# Altium footprint library ICs And Semiconductors SMD_BGA.PcbLib: 118 footprints (part 1 of 17)
Each footprint in its own frame and in the unit in brackets; x right, y up, seen from the top. Pads: shape width x height; smd on the part's side, far side on the other; paste and mask are expansions set on the pad; w line width, h text height; cw(c..) or ccw(c..) is an arc to the next point about the centre after c.
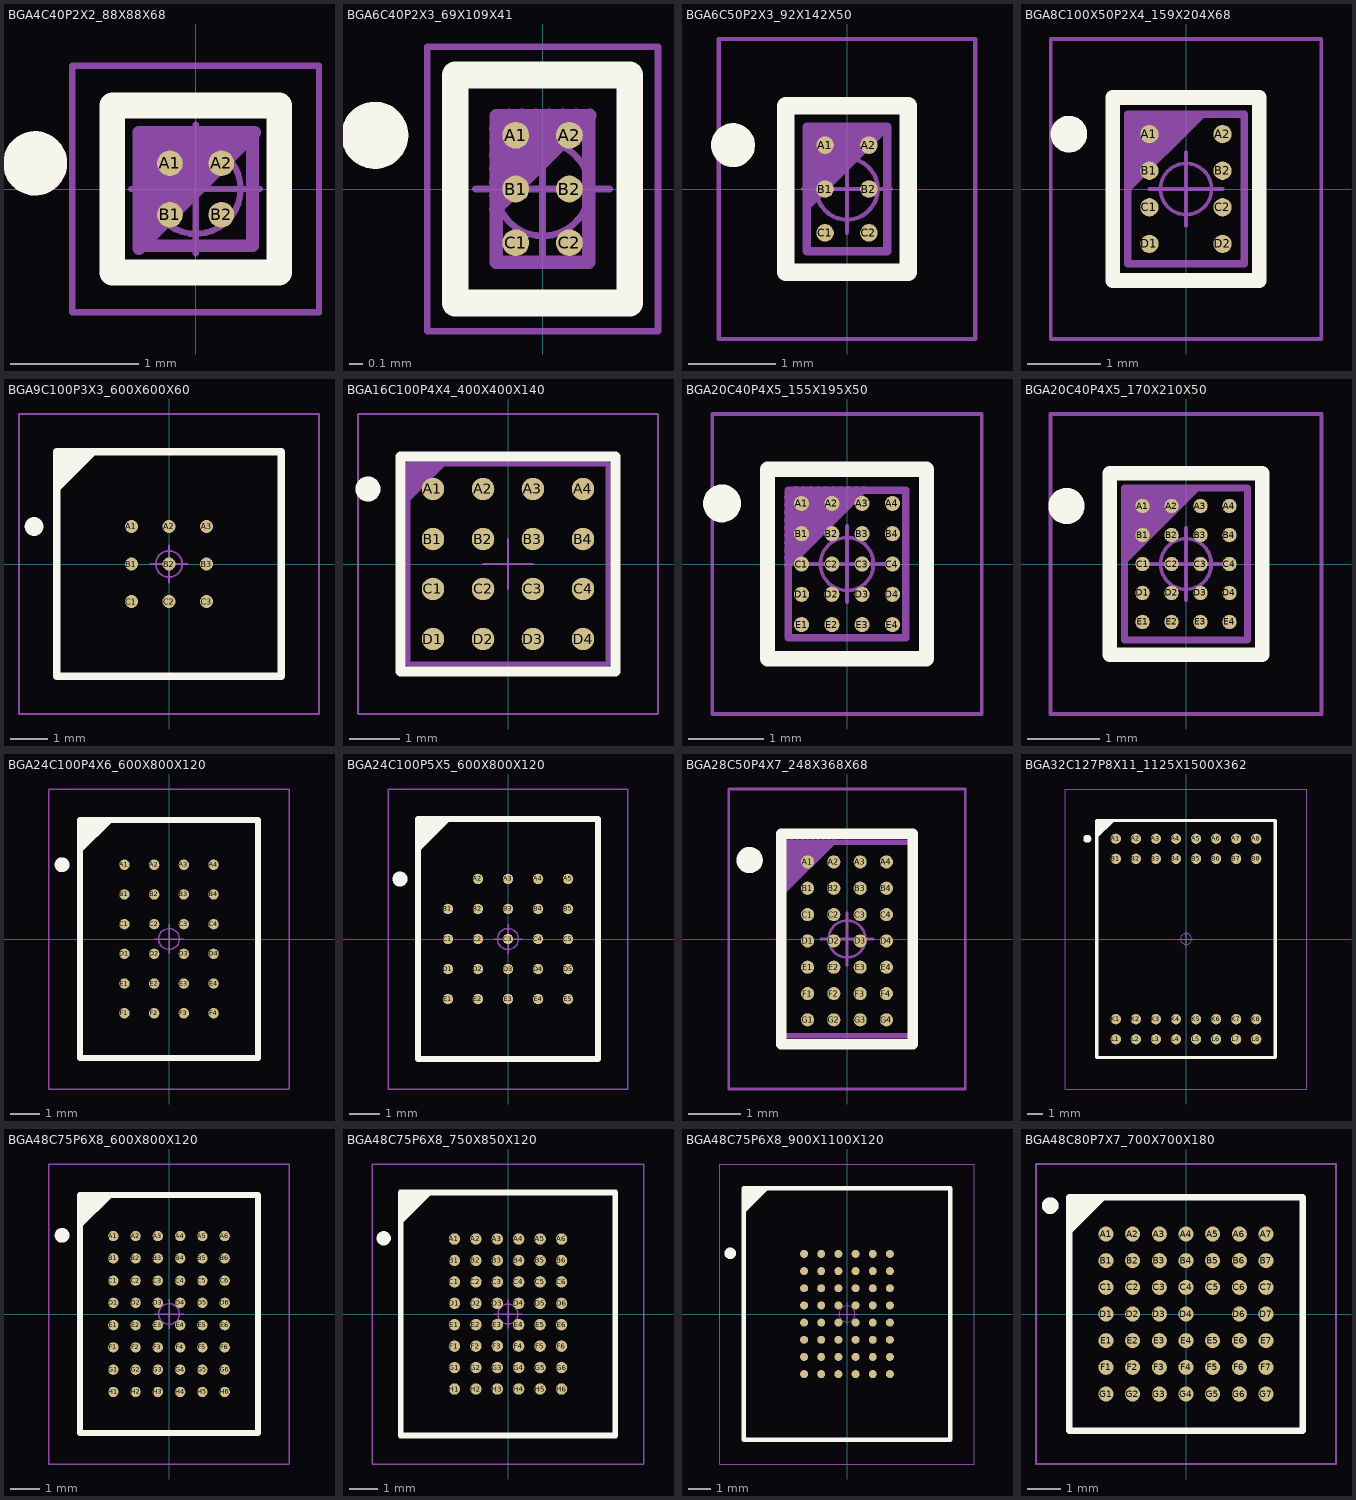
[diagram p0: the footprints below, top view; thin cyan lines are the x and y axes]

## BGA4C40P2X2_88X88X68 [mm] "BGA, 0.40mm Pitch, Square; 4 Pin, 2 Columns X 2 Rows, 0.884mm X 0.884mm X 0.675mm H"
height 0.675
pads (4):
  round 0.2 smd: A1(-0.2,0.2) A2(0.2,0.2) B1(-0.2,-0.2) B2(0.2,-0.2)
Top Overlay:
  circle w0.25: c-1.25,0.2 r0.125
  lines w0.2: -0.65,-0.65 0.65,-0.65 0.65,0.65 -0.65,0.65 -0.65,-0.65
Mechanical 14:
  lines w0.1: -0.442,-0.442 0.442,-0.442 0.442,0.442 -0.442,0.442 -0.442,-0.462 0.46,0.44 ; -0.44,-0.36 0.36,0.44 ; -0.44,-0.26 0.26,0.44 ; -0.44,-0.16 0.16,0.44 ; -0.44,-0.06 0.06,0.44 ; -0.44,0.04 -0.04,0.44 ; -0.44,0.14 -0.14,0.44 ; -0.44,0.24 -0.24,0.44 ; -0.44,0.34 -0.34,0.44
  text "1" at 0.45,-0.164 h0.75
Mechanical 15:
  circle w0.05: c0,0 r0.35
  lines w0.05: -0.5,0 0.5,0 ; 0,-0.5 0,0.5 ; -0.96,-0.96 0.96,-0.96 0.96,0.96 -0.96,0.96 -0.96,-0.96
3D body "BGA4C40P2X2_88X88X68.stp": height 0.67, standoff 0, extent -0.457,-0.457 0.457,0.457

## BGA6C40P2X3_69X109X41 [mm] "BGA, 0.40mm Pitch, Rect.; 6 Pin, 2 Columns X 3 rows, 0.69mm X 1.09mm X 0.41mm H"
height 0.41
pads (6):
  round 0.2 smd: A1(-0.2,0.4) A2(0.2,0.4) B1(-0.2,0) B2(0.2,0) C1(-0.2,-0.4) C2(0.2,-0.4)
Top Overlay:
  circle w0.25: c-1.25,0.4 r0.125
  lines w0.2: -0.65,-0.85 0.65,-0.85 0.65,0.85 -0.65,0.85 -0.65,-0.85
Mechanical 14:
  lines w0.1: -0.35,-0.15 0.35,0.55 ; -0.35,-0.05 0.25,0.55 ; -0.35,0.05 0.15,0.55 ; -0.35,0.15 0.05,0.55 ; -0.35,0.25 -0.05,0.55 ; -0.35,0.35 -0.15,0.55 ; -0.35,0.45 -0.25,0.55 ; -0.345,-0.545 0.345,-0.545 0.345,0.545 -0.345,0.545 -0.345,-0.545
Mechanical 15:
  circle w0.05: c0,0 r0.35
  lines w0.05: -0.5,0 0.5,0 ; 0,-0.5 0,0.5 ; -0.86,-1.06 0.86,-1.06 0.86,1.06 -0.86,1.06 -0.86,-1.06
3D body "BGA6C40P2X3_69X109X41.stp": height 0.41, standoff 0, extent -0.345,-0.545 0.345,0.545

## BGA6C50P2X3_92X142X50 [mm] "BGA, 0.40mm Pitch, Rect.; 6 Pin, 2 Columns X 3 rows, 0.92mm X 1.42mm X 0.50mm H"
height 0.5
pads (6):
  round 0.2 smd: A1(-0.25,0.5) A2(0.25,0.5) B1(-0.25,0) B2(0.25,0) C1(-0.25,-0.5) C2(0.25,-0.5)
Top Overlay:
  circle w0.25: c-1.3,0.5 r0.125
  lines w0.2: -0.7,-0.95 -0.7,0.95 0.7,0.95 0.7,-0.95 -0.7,-0.95
Mechanical 14:
  lines w0.1: -0.46,-0.19 0.44,0.71 ; -0.46,-0.09 0.34,0.71 ; -0.46,0.01 0.24,0.71 ; -0.46,0.11 0.14,0.71 ; -0.46,0.21 0.04,0.71 ; -0.46,0.31 -0.06,0.71 ; -0.46,0.41 -0.16,0.71 ; -0.46,0.51 -0.26,0.71 ; -0.46,0.61 -0.36,0.71 ; -0.46,-0.71 -0.46,0.71 0.46,0.71 0.46,-0.71 -0.46,-0.71
Mechanical 15:
  circle w0.05: c0,0 r0.35
  lines w0.05: -0.5,0 0.5,0 ; 0,-0.5 0,0.5 ; -1.46,-1.71 -1.46,1.71 1.46,1.71 1.46,-1.71 -1.46,-1.71
3D body "BGA6C50P2X3_92X142X50.stp": height 0.5, standoff 0, extent -0.46,-0.71 0.46,0.71

## BGA8C100X50P2X4_159X204X68 [mm] "BGA, 1.00mm Pitch, Body 1.59x2.04x0.68mm; 8 Pin, 2 Columns X 4 Rows"
height 0.68
pads (8):
  round 0.25 smd: A1(-0.5,0.75) A2(0.5,0.75) B1(-0.5,0.25) B2(0.5,0.25) C1(-0.5,-0.25) C2(0.5,-0.25) D1(-0.5,-0.75) D2(0.5,-0.75)
Top Overlay:
  circle w0.25: c-1.6,0.75 r0.125
  lines w0.2: -1,-1.25 1,-1.25 1,1.25 -1,1.25 -1,-1.25
Mechanical 14:
  lines w0.1: -0.8,0 0.2,1 ; -0.8,0.1 0.1,1 ; -0.8,0.2 0,1 ; -0.8,0.3 -0.1,1 ; -0.8,0.4 -0.2,1 ; -0.8,0.5 -0.3,1 ; -0.8,0.6 -0.4,1 ; -0.8,0.7 -0.5,1 ; -0.8,0.8 -0.6,1 ; -0.8,0.9 -0.7,1 ; -0.795,-1.02 0.795,-1.02 0.795,1.02 -0.795,1.02 -0.795,-1.02
Mechanical 15:
  circle w0.05: c0,0 r0.35
  lines w0.05: -0.5,0 0.5,0 ; 0,-0.5 0,0.5 ; -1.85,-2.05 1.85,-2.05 1.85,2.05 -1.85,2.05 -1.85,-2.05
3D body "BGA8C100X50P2X4_159X204X68.stp": height 0.68, standoff 0, extent -0.81,-1.035 0.81,1.035

## BGA9C100P3X3_600X600X60 [mm] "BGA, 1.00mm Pitch, Body 6.00x6.00x0.60mm; 9 Pin, 3 Columns X 3 Rows"
height 0.6
pads (9):
  round 0.35 smd: A1(-1,1) A2(0,1) A3(1,1) B1(-1,0) B2(0,0) B3(1,0) C1(-1,-1) C2(0,-1) C3(1,-1)
Top Overlay:
  circle w0.25: c-3.6,1 r0.125
  lines w0.2: -3,2 -2,3 ; -3,2.2 -2.2,3 ; -3,2.4 -2.4,3 ; -3,2.6 -2.6,3 ; -3,2.8 -2.8,3 ; -3,-3 -3,3 3,3 3,-3 -3,-3
Mechanical 14:
  lines w0.1: -3,2 -2,3 ; -3,2.1 -2.1,3 ; -3,2.2 -2.2,3 ; -3,2.3 -2.3,3 ; -3,2.4 -2.4,3 ; -3,2.5 -2.5,3 ; -3,2.6 -2.6,3 ; -3,2.7 -2.7,3 ; -3,2.8 -2.8,3 ; -3,2.9 -2.9,3 ; -3,-3 -3,3 3,3 3,-3 -3,-3
Mechanical 15:
  circle w0.05: c0,0 r0.35
  lines w0.05: -0.5,0 0.5,0 ; 0,-0.5 0,0.5 ; -4,-4 -4,4 4,4 4,-4 -4,-4
3D body "BGA9C100P3X3_600X600X60.stp": height 0.6, standoff 0, extent -3.05,-3.05 3.05,3.05

## BGA16C100P4X4_400X400X140 [mm] "BGA, 1.00mm pitch, square; 16 pin, 4 columns X 4 rows, 4.00mm X 4.00mm"
height 1.4
pads (16):
  round 0.45 smd: A1(-1.5,1.5) A2(-0.5,1.5) A3(0.5,1.5) A4(1.5,1.5) B1(-1.5,0.5) B2(-0.5,0.5) B3(0.5,0.5) B4(1.5,0.5) C1(-1.5,-0.5) C2(-0.5,-0.5) C3(0.5,-0.5) C4(1.5,-0.5) D1(-1.5,-1.5) D2(-0.5,-1.5) D3(0.5,-1.5) D4(1.5,-1.5)
Top Overlay:
  circle w0.25: c-2.8,1.5 r0.125
  lines w0.2: -2.15,-2.15 -2.15,2.15 2.15,2.15 2.15,-2.15 -2.15,-2.15
Mechanical 14:
  lines w0.1: -2,1.3 -1.3,2 ; -2,1.4 -1.4,2 ; -2,1.5 -1.5,2 ; -2,1.6 -1.6,2 ; -2,1.7 -1.7,2 ; -2,1.8 -1.8,2 ; -2,1.9 -1.9,2 ; -2,-2 -2,2 2,2 2,-2 -2,-2
Mechanical 15:
  lines w0.05: -0.5,0 0.5,0 ; 0,-0.5 0,0.5 ; -3,-3 -3,3 3,3 3,-3 -3,-3
3D body "BGA16C100P4X4_400X400X140.stp": height 1.4, standoff 0, extent -2,-2 2,2

## BGA20C40P4X5_155X195X50 [mm] "BGA, 0.40mm Pitch, Rect, 20 Pin, 4 Columns X 5 rows, 1.55mm X 1.95mm X 0.50mm H"
height 0.5
pads (20):
  round 0.2 smd: A1(-0.6,0.8) A2(-0.2,0.8) A3(0.2,0.8) A4(0.6,0.8) B1(-0.6,0.4) B2(-0.2,0.4) B3(0.2,0.4) B4(0.6,0.4) C1(-0.6,0) C2(-0.2,0) C3(0.2,0) C4(0.6,0) D1(-0.6,-0.4) D2(-0.2,-0.4) D3(0.2,-0.4) D4(0.6,-0.4) E1(-0.6,-0.8) E2(-0.2,-0.8) E3(0.2,-0.8) E4(0.6,-0.8)
Top Overlay:
  circle w0.25: c-1.65,0.8 r0.125
  lines w0.2: -1.05,-1.25 1.05,-1.25 1.05,1.25 -1.05,1.25 -1.05,-1.25
Mechanical 14:
  lines w0.1: -0.78,-0.02 0.22,0.98 ; -0.78,0.08 0.12,0.98 ; -0.78,0.18 0.02,0.98 ; -0.78,0.28 -0.08,0.98 ; -0.78,0.38 -0.18,0.98 ; -0.78,0.48 -0.28,0.98 ; -0.78,0.58 -0.38,0.98 ; -0.78,0.68 -0.48,0.98 ; -0.78,0.78 -0.58,0.98 ; -0.78,0.88 -0.68,0.98 ; -0.775,-0.975 0.775,-0.975 0.775,0.975 -0.775,0.975 -0.775,-0.975
Mechanical 15:
  circle w0.05: c0,0 r0.35
  lines w0.05: -0.5,0 0.5,0 ; 0,-0.5 0,0.5 ; -1.78,-1.98 1.78,-1.98 1.78,1.98 -1.78,1.98 -1.78,-1.98
3D body "BGA20C40P4X5_155X195X50.stp": height 0.5, standoff 0, extent -0.775,-0.975 0.775,0.975

## BGA20C40P4X5_170X210X50 [mm] "BGA, 0.40mm Pitch, Rect, 20 Pin, 4 Columns X 5 Rows, 1.70mm X 2.10mm X 0.50mm H"
height 0.5
pads (20):
  round 0.2 smd: A1(-0.6,0.8) A2(-0.2,0.8) A3(0.2,0.8) A4(0.6,0.8) B1(-0.6,0.4) B2(-0.2,0.4) B3(0.2,0.4) B4(0.6,0.4) C1(-0.6,0) C2(-0.2,0) C3(0.2,0) C4(0.6,0) D1(-0.6,-0.4) D2(-0.2,-0.4) D3(0.2,-0.4) D4(0.6,-0.4) E1(-0.6,-0.8) E2(-0.2,-0.8) E3(0.2,-0.8) E4(0.6,-0.8)
Top Overlay:
  circle w0.25: c-1.65,0.8 r0.125
  lines w0.2: -1.05,-1.25 1.05,-1.25 1.05,1.25 -1.05,1.25 -1.05,-1.25
Mechanical 8:
  lines w0.001: -0.85,-1.05 0.85,-1.05 0.85,1.05 -0.85,1.05 -0.85,-1.05
Mechanical 14:
  lines w0.1: -0.85,0.05 0.15,1.05 ; -0.85,0.15 0.05,1.05 ; -0.85,0.25 -0.05,1.05 ; -0.85,0.35 -0.15,1.05 ; -0.85,0.45 -0.25,1.05 ; -0.85,0.55 -0.35,1.05 ; -0.85,0.65 -0.45,1.05 ; -0.85,0.75 -0.55,1.05 ; -0.85,0.85 -0.65,1.05 ; -0.85,0.95 -0.75,1.05 ; -0.85,-1.05 0.85,-1.05 0.85,1.05 -0.85,1.05 -0.85,-1.05
  text "1" at 0.45,-0.164 h0.75
Mechanical 15:
  circle w0.05: c0,0 r0.35
  lines w0.05: -0.5,0 0.5,0 ; 0,-0.5 0,0.5 ; -1.87,-2.07 1.87,-2.07 1.87,2.07 -1.87,2.07 -1.87,-2.07
3D body "BGA20C40P4X5_170X210X50.stp": height 0.5, standoff 0, extent -0.85,-1.05 0.85,1.05

## BGA24C100P4X6_600X800X120 [mm] "BGA, 1.00mm Pitch, Rect.; 24 Pin, 4 Columns X 6 Rows, 6.00mm X 8.00mm X 1.20mm H"
height 1.2
pads (24):
  round 0.35 smd: A1(-1.5,2.5) A2(-0.5,2.5) A3(0.5,2.5) A4(1.5,2.5) B1(-1.5,1.5) B2(-0.5,1.5) B3(0.5,1.5) B4(1.5,1.5) C1(-1.5,0.5) C2(-0.5,0.5) C3(0.5,0.5) C4(1.5,0.5) D1(-1.5,-0.5) D2(-0.5,-0.5) D3(0.5,-0.5) D4(1.5,-0.5) E1(-1.5,-1.5) E2(-0.5,-1.5) E3(0.5,-1.5) E4(1.5,-1.5) F1(-1.5,-2.5) F2(-0.5,-2.5) F3(0.5,-2.5) F4(1.5,-2.5)
Top Overlay:
  circle w0.25: c-3.6,2.5 r0.125
  lines w0.2: -3,3 -2,4 ; -3,3.2 -2.2,4 ; -3,3.4 -2.4,4 ; -3,3.6 -2.6,4 ; -3,3.8 -2.8,4 ; -3,-4 -3,4 3,4 3,-4 -3,-4
Mechanical 14:
  lines w0.1: -3,3 -2,4 ; -3,3.1 -2.1,4 ; -3,3.2 -2.2,4 ; -3,3.3 -2.3,4 ; -3,3.4 -2.4,4 ; -3,3.5 -2.5,4 ; -3,3.6 -2.6,4 ; -3,3.7 -2.7,4 ; -3,3.8 -2.8,4 ; -3,3.9 -2.9,4 ; -3,-4 -3,4 3,4 3,-4 -3,-4
Mechanical 15:
  circle w0.05: c0,0 r0.35
  lines w0.05: -0.5,0 0.5,0 ; 0,-0.5 0,0.5 ; -4.05,-5.05 -4.05,5.05 4.05,5.05 4.05,-5.05 -4.05,-5.05
3D body "BGA24C100P4X6_600X800X120.stp": height 1, standoff 0, extent -3,-4 3,4

## BGA24C100P5X5_600X800X120 [mm] "BGA, 1.00mm Pitch, Rect.; 24 Pin, 5 Columns X 5 rows,6.00mm X 8.00mm X 1.20mm H"
height 1.4
pads (24):
  round 0.35 smd: A2(-1,2) A3(0,2) A4(1,2) A5(2,2) B1(-2,1) B2(-1,1) B3(0,1) B4(1,1) B5(2,1) C1(-2,0) C2(-1,0) C3(0,0) C4(1,0) C5(2,0) D1(-2,-1) D2(-1,-1) D3(0,-1) D4(1,-1) D5(2,-1) E1(-2,-2) E2(-1,-2) E3(0,-2) E4(1,-2) E5(2,-2)
Top Overlay:
  circle w0.25: c-3.6,2 r0.125
  lines w0.2: -3,3 -2,4 ; -3,3.2 -2.2,4 ; -3,3.4 -2.4,4 ; -3,3.6 -2.6,4 ; -3,3.8 -2.8,4 ; -3,-4 -3,4 3,4 3,-4 -3,-4
Mechanical 14:
  lines w0.1: -3,3 -2,4 ; -3,3.1 -2.1,4 ; -3,3.2 -2.2,4 ; -3,3.3 -2.3,4 ; -3,3.4 -2.4,4 ; -3,3.5 -2.5,4 ; -3,3.6 -2.6,4 ; -3,3.7 -2.7,4 ; -3,3.8 -2.8,4 ; -3,3.9 -2.9,4 ; -3,-4 -3,4 3,4 3,-4 -3,-4
Mechanical 15:
  circle w0.05: c0,0 r0.35
  lines w0.05: -0.5,0 0.5,0 ; 0,-0.5 0,0.5 ; -4,-5 -4,5 4,5 4,-5 -4,-5
3D body "BGA24C100P5X5_600X800X120.stp": height 1.2, standoff 0, extent -3,-4 3,4

## BGA28C50P4X7_248X368X68 [mm] "BGA, 0.50mm Pitch, Body 2.48x3.68x0.68mm; 28 Pin, 4 Columns X 7 Rows"
height 0.68
pads (28):
  round 0.25 smd: A1(-0.75,1.464) A2(-0.25,1.464) A3(0.25,1.464) A4(0.75,1.464) B1(-0.75,0.964) B2(-0.25,0.964) B3(0.25,0.964) B4(0.75,0.964) C1(-0.75,0.464) C2(-0.25,0.464) C3(0.25,0.464) C4(0.75,0.464) D1(-0.75,-0.036) D2(-0.25,-0.036) D3(0.25,-0.036) D4(0.75,-0.036) E1(-0.75,-0.536) E2(-0.25,-0.536) E3(0.25,-0.536) E4(0.75,-0.536) F1(-0.75,-1.036) F2(-0.25,-1.036) F3(0.25,-1.036) F4(0.75,-1.036) G1(-0.75,-1.536) G2(-0.25,-1.536) G3(0.25,-1.536) G4(0.75,-1.536)
Top Overlay:
  circle w0.25: c-1.85,1.5 r0.125
  lines w0.2: -1.25,-2 1.25,-2 1.25,2 -1.25,2 -1.25,-2
Mechanical 14:
  lines w0.1: -1.25,0.85 -0.25,1.85 ; -1.25,0.95 -0.35,1.85 ; -1.25,1.05 -0.45,1.85 ; -1.25,1.15 -0.55,1.85 ; -1.25,1.25 -0.65,1.85 ; -1.25,1.35 -0.75,1.85 ; -1.25,1.45 -0.85,1.85 ; -1.25,1.55 -0.95,1.85 ; -1.25,1.65 -1.05,1.85 ; -1.25,1.75 -1.15,1.85 ; -1.24,-1.84 1.24,-1.84 1.24,1.84 -1.24,1.84 -1.24,-1.84
  text "A" at -1.8,1.35 h0.4
  text "G" at -1.85,-1.725 h0.4
  text "1" at -0.85,2.2 h0.4
  text "4" at 0.625,2.175 h0.4
Mechanical 15:
  circle w0.05: c0,0 r0.35
  lines w0.05: -0.5,0 0.5,0 ; 0,-0.5 0,0.5 ; -2.25,-2.85 2.25,-2.85 2.25,2.85 -2.25,2.85 -2.25,-2.85
3D body "BGA28C50P4X7_248X368X68.stp": height 0.68, standoff 0, extent -1.24,-1.84 1.24,1.84

## BGA32C127P8X11_1125X1500X362 [mm] "BGA, 1.27mm Pitch, Rect.;32 Pin,8 Columns X 11 Rows, 11.25mm X 15.00mm X 3.62mm H"
height 3.62
pads (32):
  round 0.65 smd: A1(-4.445,6.35) A2(-3.175,6.35) A3(-1.905,6.35) A4(-0.635,6.35) A5(0.635,6.35) A6(1.905,6.35) A7(3.175,6.35) A8(4.445,6.35) B1(-4.445,5.08) B2(-3.175,5.08) B3(-1.905,5.08) B4(-0.635,5.08) B5(0.635,5.08) B6(1.905,5.08) B7(3.175,5.08) B8(4.445,5.08) K1(-4.445,-5.08) K2(-3.175,-5.08) K3(-1.905,-5.08) K4(-0.635,-5.08) K5(0.635,-5.08) K6(1.905,-5.08) K7(3.175,-5.08) K8(4.445,-5.08) L1(-4.445,-6.35) L2(-3.175,-6.35) L3(-1.905,-6.35) L4(-0.635,-6.35) L5(0.635,-6.35) L6(1.905,-6.35) L7(3.175,-6.35) L8(4.445,-6.35)
Top Overlay:
  circle w0.25: c-6.25,6.35 r0.125
  lines w0.2: -5.65,6.5 -4.65,7.5 ; -5.65,6.7 -4.85,7.5 ; -5.65,6.9 -5.05,7.5 ; -5.65,7.1 -5.25,7.5 ; -5.65,7.3 -5.45,7.5 ; -5.65,-7.5 5.65,-7.5 5.65,7.5 -5.65,7.5 -5.65,-7.5
Mechanical 14:
  lines w0.1: -5.65,6.5 -4.65,7.5 ; -5.65,6.6 -4.75,7.5 ; -5.65,6.7 -4.85,7.5 ; -5.65,6.8 -4.95,7.5 ; -5.65,6.9 -5.05,7.5 ; -5.65,7 -5.15,7.5 ; -5.65,7.1 -5.25,7.5 ; -5.65,7.2 -5.35,7.5 ; -5.65,7.3 -5.45,7.5 ; -5.65,7.4 -5.55,7.5 ; -5.625,-7.5 5.625,-7.5 5.625,7.5 -5.625,7.5 -5.625,-7.5
  text "L" at -6.895,-6.6 h0.6
  text "K" at -6.895,-5.33 h0.6
  text "J" at -6.895,-4.06 h0.6
  text "H" at -6.895,-2.79 h0.6
  text "G" at -6.895,-1.52 h0.6
  text "F" at -6.895,-0.25 h0.6
  text "E" at -6.895,1.02 h0.6
  text "D" at -6.895,2.29 h0.6
  text "C" at -6.895,3.56 h0.6
  text "B" at -6.895,4.83 h0.6
  text "A" at -6.895,6.1 h0.6
  text "8" at 4.73,8.35 h0.6
  text "1" at -4.22,8.4 h0.6
  text "7" at 3.46,8.35 h0.6
  text "6" at 2.19,8.35 h0.6
  text "5" at 0.92,8.35 h0.6
  text "4" at -0.35,8.35 h0.6
  text "3" at -1.62,8.35 h0.6
  text "2" at -2.89,8.35 h0.6
Mechanical 15:
  circle w0.05: c0,0 r0.35
  lines w0.05: -0.5,0 0.5,0 ; 0,-0.5 0,0.5 ; -7.65,-9.5 7.65,-9.5 7.65,9.5 -7.65,9.5 -7.65,-9.5
3D body "BGA32C127P8X11_1125X1500X362.stp": height 3.62, standoff 0, extent -5.625,-7.5 5.625,7.5

## BGA48C75P6X8_600X800X120 [mm] "BGA, 0.75mm Pitch, Rect.; 48 Pin, 6 Columns X 8 Rows, 6mm X 8mm X 1.20mm H, IPC Medium Density"
height 1.2
pads (48):
  round 0.35 smd: A1(-1.875,2.625) A2(-1.125,2.625) A3(-0.375,2.625) A4(0.375,2.625) A5(1.125,2.625) A6(1.875,2.625) B1(-1.875,1.875) B2(-1.125,1.875) B3(-0.375,1.875) B4(0.375,1.875) B5(1.125,1.875) B6(1.875,1.875) C1(-1.875,1.125) C2(-1.125,1.125) C3(-0.375,1.125) C4(0.375,1.125) C5(1.125,1.125) C6(1.875,1.125) D1(-1.875,0.375) D2(-1.125,0.375) D3(-0.375,0.375) D4(0.375,0.375) D5(1.125,0.375) D6(1.875,0.375) E1(-1.875,-0.375) E2(-1.125,-0.375) E3(-0.375,-0.375) E4(0.375,-0.375) E5(1.125,-0.375) E6(1.875,-0.375) F1(-1.875,-1.125) F2(-1.125,-1.125) F3(-0.375,-1.125) F4(0.375,-1.125) F5(1.125,-1.125) F6(1.875,-1.125) G1(-1.875,-1.875) G2(-1.125,-1.875) G3(-0.375,-1.875) G4(0.375,-1.875) G5(1.125,-1.875) G6(1.875,-1.875) H1(-1.875,-2.625) H2(-1.125,-2.625) H3(-0.375,-2.625) H4(0.375,-2.625) H5(1.125,-2.625) H6(1.875,-2.625)
Top Overlay:
  circle w0.25: c-3.6,2.65 r0.125
  lines w0.2: -3,3 -2,4 ; -3,3.2 -2.2,4 ; -3,3.4 -2.4,4 ; -3,3.6 -2.6,4 ; -3,3.8 -2.8,4 ; -3,-4 -3,4 3,4 3,-4 -3,-4
Mechanical 14:
  lines w0.1: -3,3 -2,4 ; -3,3.1 -2.1,4 ; -3,3.2 -2.2,4 ; -3,3.3 -2.3,4 ; -3,3.4 -2.4,4 ; -3,3.5 -2.5,4 ; -3,3.6 -2.6,4 ; -3,3.7 -2.7,4 ; -3,3.8 -2.8,4 ; -3,3.9 -2.9,4 ; -3,-4 -3,4 3,4 3,-4 -3,-4
Mechanical 15:
  circle w0.05: c0,0 r0.35
  lines w0.05: -0.5,0 0.5,0 ; 0,-0.5 0,0.5 ; -4.05,-5.05 -4.05,5.05 4.05,5.05 4.05,-5.05 -4.05,-5.05
3D body "BGA48C75P6X8_600X800X120.stp": height 1.2, standoff 0, extent -3,-4 3,4

## BGA48C75P6X8_750X850X120 [mm] "BGA, 0.75mm Pitch, Rect.; 48 Pin, 6 Columns X 8 Rows, 7.50mm X 8.50mm X 1.20mm H, IPC Medium Density"
height 1.2
pads (48):
  round 0.4 smd: A1(-1.875,2.625) A2(-1.125,2.625) A3(-0.375,2.625) A4(0.375,2.625) A5(1.125,2.625) A6(1.875,2.625) B1(-1.875,1.875) B2(-1.125,1.875) B3(-0.375,1.875) B4(0.375,1.875) B5(1.125,1.875) B6(1.875,1.875) C1(-1.875,1.125) C2(-1.125,1.125) C3(-0.375,1.125) C4(0.375,1.125) C5(1.125,1.125) C6(1.875,1.125) D1(-1.875,0.375) D2(-1.125,0.375) D3(-0.375,0.375) D4(0.375,0.375) D5(1.125,0.375) D6(1.875,0.375) E1(-1.875,-0.375) E2(-1.125,-0.375) E3(-0.375,-0.375) E4(0.375,-0.375) E5(1.125,-0.375) E6(1.875,-0.375) F1(-1.875,-1.125) F2(-1.125,-1.125) F3(-0.375,-1.125) F4(0.375,-1.125) F5(1.125,-1.125) F6(1.875,-1.125) G1(-1.875,-1.875) G2(-1.125,-1.875) G3(-0.375,-1.875) G4(0.375,-1.875) G5(1.125,-1.875) G6(1.875,-1.875) H1(-1.875,-2.625) H2(-1.125,-2.625) H3(-0.375,-2.625) H4(0.375,-2.625) H5(1.125,-2.625) H6(1.875,-2.625)
Top Overlay:
  circle w0.25: c-4.35,2.65 r0.125
  lines w0.2: -3.75,3.25 -2.75,4.25 ; -3.75,3.45 -2.95,4.25 ; -3.75,3.65 -3.15,4.25 ; -3.75,3.85 -3.35,4.25 ; -3.75,4.05 -3.55,4.25 ; -3.75,-4.25 -3.75,4.25 3.75,4.25 3.75,-4.25 -3.75,-4.25
Mechanical 14:
  lines w0.1: -3.75,3.25 -2.75,4.25 ; -3.75,3.35 -2.85,4.25 ; -3.75,3.45 -2.95,4.25 ; -3.75,3.55 -3.05,4.25 ; -3.75,3.65 -3.15,4.25 ; -3.75,3.75 -3.25,4.25 ; -3.75,3.85 -3.35,4.25 ; -3.75,3.95 -3.45,4.25 ; -3.75,4.05 -3.55,4.25 ; -3.75,4.15 -3.65,4.25 ; -3.75,-4.25 -3.75,4.25 3.75,4.25 3.75,-4.25 -3.75,-4.25
Mechanical 15:
  circle w0.05: c0,0 r0.35
  lines w0.05: -0.5,0 0.5,0 ; 0,-0.5 0,0.5 ; -4.75,-5.25 -4.75,5.25 4.75,5.25 4.75,-5.25 -4.75,-5.25
3D body "BGA48C75P6X8_750X850X120.stp": height 1.2, standoff 0, extent -3.75,-4.25 3.75,4.25

## BGA48C75P6X8_900X1100X120 [mm] "BGA, 0.75mm Pitch, Rect.; 48 Pin, 6 Columns X 8 Rows, 9mm X 11mm X 1.20mm H, IPC Medium Density"
height 1.2
pads (48):
  round 0.35 smd: A1(-1.875,2.625) A2(-1.125,2.625) A3(-0.375,2.625) A4(0.375,2.625) A5(1.125,2.625) A6(1.875,2.625) B1(-1.875,1.875) B2(-1.125,1.875) B3(-0.375,1.875) B4(0.375,1.875) B5(1.125,1.875) B6(1.875,1.875) C1(-1.875,1.125) C2(-1.125,1.125) C3(-0.375,1.125) C4(0.375,1.125) C5(1.125,1.125) C6(1.875,1.125) D1(-1.875,0.375) D2(-1.125,0.375) D3(-0.375,0.375) D4(0.375,0.375) D5(1.125,0.375) D6(1.875,0.375) E1(-1.875,-0.375) E2(-1.125,-0.375) E3(-0.375,-0.375) E4(0.375,-0.375) E5(1.125,-0.375) E6(1.875,-0.375) F1(-1.875,-1.125) F2(-1.125,-1.125) F3(-0.375,-1.125) F4(0.375,-1.125) F5(1.125,-1.125) F6(1.875,-1.125) G1(-1.875,-1.875) G2(-1.125,-1.875) G3(-0.375,-1.875) G4(0.375,-1.875) G5(1.125,-1.875) G6(1.875,-1.875) H1(-1.875,-2.625) H2(-1.125,-2.625) H3(-0.375,-2.625) H4(0.375,-2.625) H5(1.125,-2.625) H6(1.875,-2.625)
Top Overlay:
  circle w0.25: c-5.1,2.65 r0.125
  lines w0.2: -4.5,4.5 -3.5,5.5 ; -4.5,4.7 -3.7,5.5 ; -4.5,4.9 -3.9,5.5 ; -4.5,5.1 -4.1,5.5 ; -4.5,5.3 -4.3,5.5 ; -4.5,-5.5 -4.5,5.5 4.5,5.5 4.5,-5.5 -4.5,-5.5
Mechanical 14:
  lines w0.1: -4.5,4.5 -3.5,5.5 ; -4.5,4.6 -3.6,5.5 ; -4.5,4.7 -3.7,5.5 ; -4.5,4.8 -3.8,5.5 ; -4.5,4.9 -3.9,5.5 ; -4.5,5 -4,5.5 ; -4.5,5.1 -4.1,5.5 ; -4.5,5.2 -4.2,5.5 ; -4.5,5.3 -4.3,5.5 ; -4.5,5.4 -4.4,5.5 ; -4.5,-5.5 -4.5,5.5 4.5,5.5 4.5,-5.5 -4.5,-5.5
Mechanical 15:
  circle w0.05: c0,0 r0.35
  lines w0.05: -0.5,0 0.5,0 ; 0,-0.5 0,0.5 ; -5.55,-6.55 -5.55,6.55 5.55,6.55 5.55,-6.55 -5.55,-6.55
3D body "BGA48C75P6X8_900X1100X120.stp": height 1.2, standoff 0, extent -4.45,-5.45 4.55,5.55

## BGA48C80P7X7_700X700X180 [mm] "BGA, 48-Leads, Body 7x7mm, Pitch 0.8mm, IPC Medium Density"
height 1.8
pads (48):
  round 0.45 smd: A1(-2.4,2.4) A2(-1.6,2.4) A3(-0.8,2.4) A4(0,2.4) A5(0.8,2.4) A6(1.6,2.4) A7(2.4,2.4) B1(-2.4,1.6) B2(-1.6,1.6) B3(-0.8,1.6) B4(0,1.6) B5(0.8,1.6) B6(1.6,1.6) B7(2.4,1.6) C1(-2.4,0.8) C2(-1.6,0.8) C3(-0.8,0.8) C4(0,0.8) C5(0.8,0.8) C6(1.6,0.8) C7(2.4,0.8) D1(-2.4,0) D2(-1.6,0) D3(-0.8,0) D4(0,0) D6(1.6,0) D7(2.4,0) E1(-2.4,-0.8) E2(-1.6,-0.8) E3(-0.8,-0.8) E4(0,-0.8) E5(0.8,-0.8) E6(1.6,-0.8) E7(2.4,-0.8) F1(-2.4,-1.6) F2(-1.6,-1.6) F3(-0.8,-1.6) F4(0,-1.6) F5(0.8,-1.6) F6(1.6,-1.6) F7(2.4,-1.6) G1(-2.4,-2.4) G2(-1.6,-2.4) G3(-0.8,-2.4) G4(0,-2.4) G5(0.8,-2.4) G6(1.6,-2.4) G7(2.4,-2.4)
Top Overlay:
  circle w0.25: c-4.075,3.25 r0.125
  region: -2.5,3.5 -3.5,2.5 -3.5,3.5
  lines w0.2: -3.5,2.5 -2.5,3.5 ; -3.5,-3.5 -3.5,3.5 3.5,3.5 3.5,-3.5 -3.5,-3.5
Mechanical 14:
  circle w0.25: c-4.075,3.25 r0.125
  region: -2.5,3.5 -3.5,2.5 -3.5,3.5
  lines w0.1: -3.5,2.5 -2.5,3.5 ; -3.5,-3.5 -3.5,3.5 3.5,3.5 3.5,-3.5 -3.5,-3.5
  text "A" at -4.05,2.35 h0.4
  text "2" at -1.8,3.75 h0.4
  text "1" at -2.5,3.75 h0.4
  text "3" at -0.9,3.75 h0.4
  text "4" at -0.1,3.75 h0.4
  text "5" at 0.7,3.75 h0.4
  text "6" at 1.5,3.75 h0.4
  text "7" at 2.3,3.75 h0.4
  text "B" at -4.05,1.45 h0.4
  text "C" at -4.05,0.65 h0.4
  text "D" at -4.05,-0.15 h0.4
  text "E" at -4.05,-0.95 h0.4
  text "F" at -4.05,-1.75 h0.4
  text "G" at -4.05,-2.55 h0.4
Mechanical 15:
  lines w0.05: -4.5,-4.5 -4.5,4.5 4.5,4.5 4.5,-4.5 -4.5,-4.5
3D body "BGA48C80P7X7_700X700X180.stp": height 1.8, standoff 0, extent -3.5,-3.5 3.5,3.5